# Altium footprint library ZZQ_PCBLib.PcbLib: 84 footprints (part 3 of 6)
Each footprint in its own frame and in the unit in brackets; x right, y up, seen from the top. Pads: shape width x height; smd on the part's side, far side on the other; paste and mask are expansions set on the pad; w line width, h text height; cw(c..) or ccw(c..) is an arc to the next point about the centre after c.
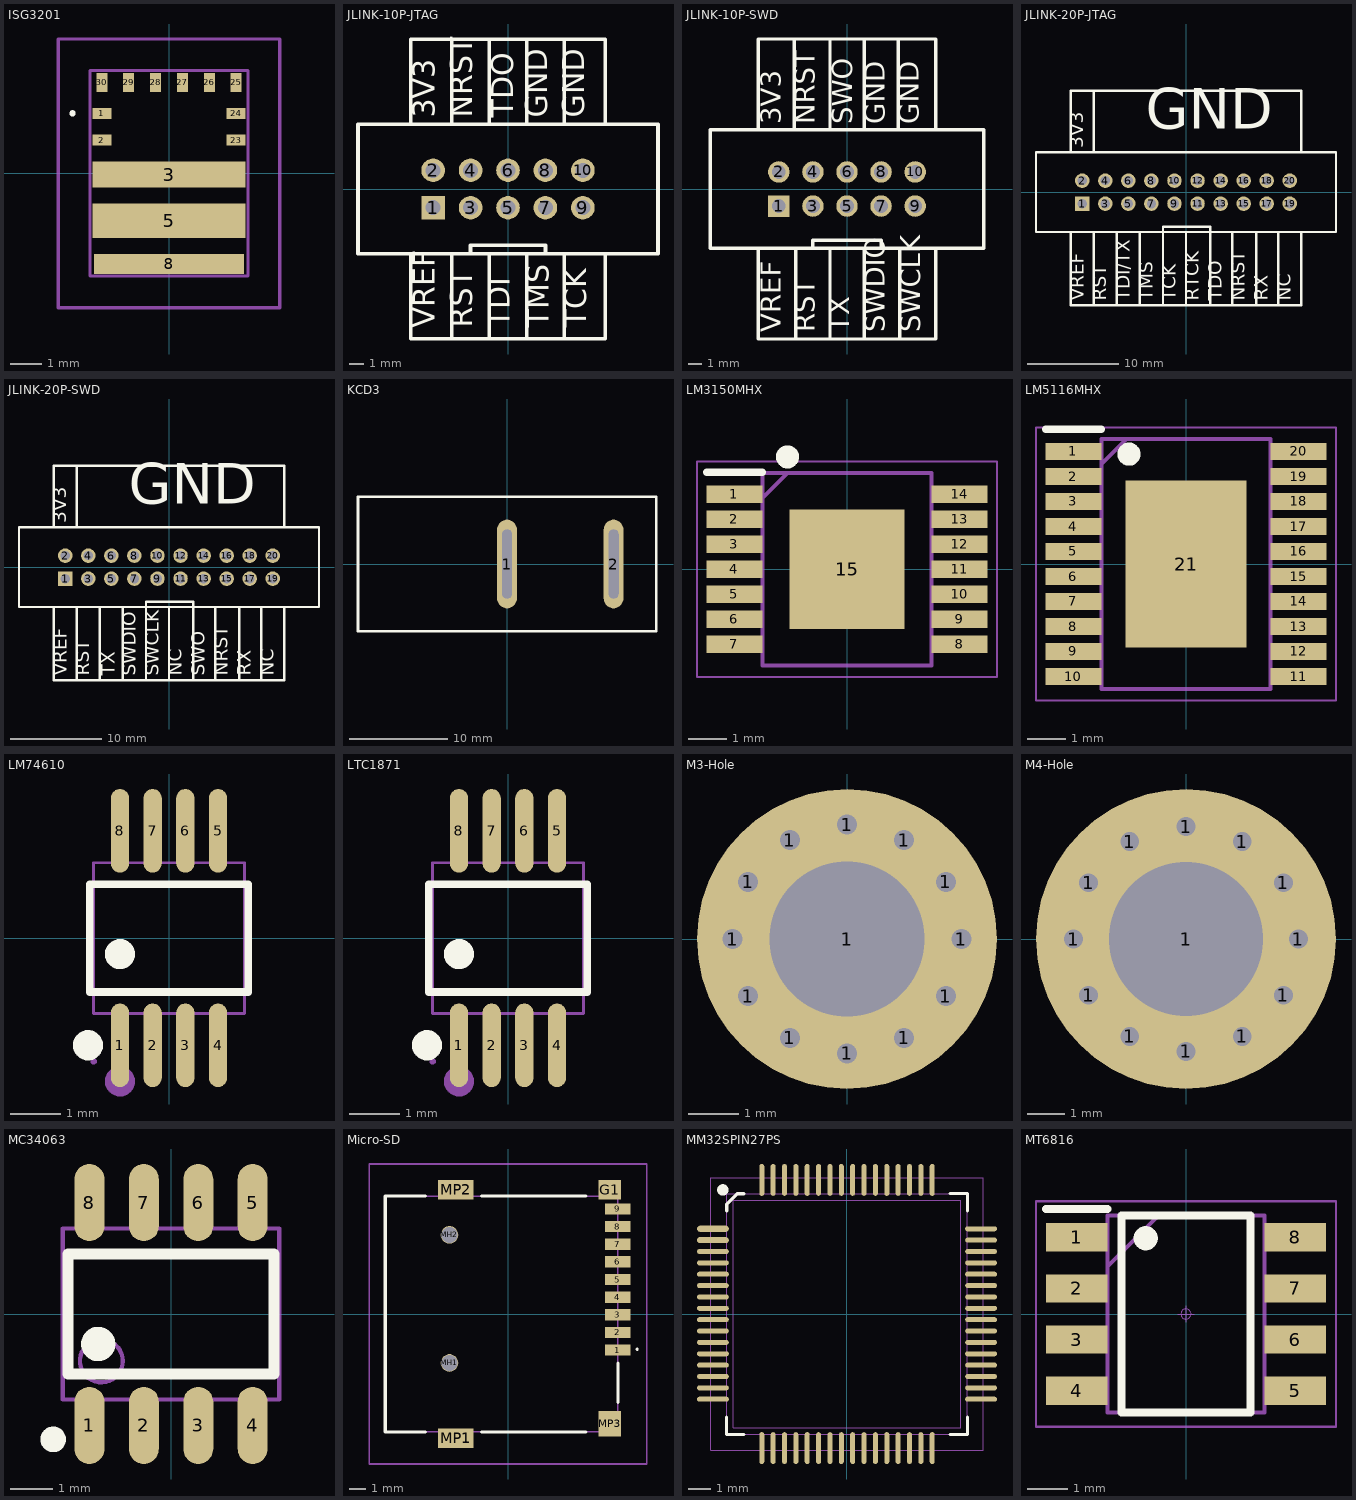
[diagram p2: the footprints below, top view; thin cyan lines are the x and y axes]

## ISG3201 [mm]
pads (13):
  rect 0.6x0.35 smd: 1(-2.125,1.9) 2(-2.125,1.05) 23(2.125,1.05) 24(2.125,1.9)
  rect 4.85x0.825 smd: 3(0,-0.037)
  rect 4.85x1.1 smd: 5(0,-1.5)
  rect 4.75x0.625 smd: 8(0,-2.862)
  rect 0.35x0.6 smd: 25(2.125,2.875) 26(1.275,2.875) 27(0.425,2.875) 28(-0.425,2.875) 29(-1.275,2.875) 30(-2.125,2.875)
Top Overlay:
  lines w0.1: -3.1,1.9 ccw(c-3.05,1.9) -3,1.9 ccw(c-3.05,1.9) -3.1,1.9
Mechanical 15:
  lines w0.1: -2.5,-3.25 -2.5,3.25 2.5,3.25 2.5,-3.25 -2.5,-3.25
Mechanical 20:
  lines w0.1: -3.5,-4.25 -3.5,4.25 3.5,4.25 3.5,-4.25 -3.5,-4.25
3D body "ISG3201.stp": height 1.32, standoff 0, extent -2.5,-3.25 2.5,3.25

## JLINK-10P-JTAG [mm]
pads (10):
  rect 1.6x1.6 hole 1.02: 1(-5.08,-1.27)
  round 1.6 hole 1.02: 2(-5.08,1.27) 3(-2.54,-1.27) 4(-2.54,1.27) 5(0,-1.27) 6(0,1.27) 7(2.54,-1.27) 8(2.54,1.27) 9(5.08,-1.27) 10(5.08,1.27)
Top Overlay:
  lines w0.254: -6.604,-4.445 -6.604,-10.16 6.604,-10.16 6.604,-4.445 ; -6.604,4.445 -6.604,10.16 6.604,10.16 6.604,4.445 ; -3.81,-10.16 -3.81,-4.445 ; -3.81,4.445 -3.81,10.16 ; -2.54,-4.4 -2.54,-3.81 2.54,-3.81 2.54,-4.4 ; -1.27,-10.16 -1.27,-4.445 ; -1.27,4.445 -1.27,10.16 ; 1.27,-10.16 1.27,-4.445 ; 1.27,4.445 1.27,10.16 ; 3.81,-10.16 3.81,-4.445 ; 3.81,4.445 3.81,10.16 ; -10.175,-4.4 10.175,-4.4 10.175,4.4 -10.175,4.4 -10.175,-4.4
  text "VREF" at -4.445,-9.398 h2.54
  text "RST" at -1.924,-9.398 h2.54
  text "TDI" at 0.635,-9.398 h2.54
  text "TMS" at 3.283,-9.398 h2.54
  text "TCK" at 5.826,-9.398 h2.54
  text "GND" at 5.696,4.826 h2.54
  text "GND" at 3.156,4.826 h2.54
  text "TDO" at 0.87,4.826 h2.54
  text "NRST" at -1.924,4.826 h2.54
  text "3V3" at -4.464,4.826 h2.54
3D body "IDC2.54-10P.STEP": height 2.54, standoff -9.63, extent -10.16,-4.35 10.16,4.5

## JLINK-10P-SWD [mm]
pads (10):
  rect 1.6x1.6 hole 1.02: 1(-5.08,-1.27)
  round 1.6 hole 1.02: 2(-5.08,1.27) 3(-2.54,-1.27) 4(-2.54,1.27) 5(0,-1.27) 6(0,1.27) 7(2.54,-1.27) 8(2.54,1.27) 9(5.08,-1.27) 10(5.08,1.27)
Top Overlay:
  lines w0.254: -6.604,-4.445 -6.604,-11.176 6.604,-11.176 6.604,-4.445 ; -6.604,4.445 -6.604,11.176 6.604,11.176 6.604,4.445 ; -3.937,4.445 -3.937,11.176 ; -3.81,-11.176 -3.81,-4.445 ; -2.54,-4.4 -2.54,-3.81 2.54,-3.81 2.54,-4.4 ; -1.27,-11.176 -1.27,-4.445 ; -1.27,4.445 -1.27,11.176 ; 1.27,-11.176 1.27,-4.445 ; 1.27,4.445 1.27,11.176 ; 3.81,4.445 3.81,11.176 ; 3.937,-11.176 3.937,-4.445 ; -10.175,-4.4 10.175,-4.4 10.175,4.4 -10.175,4.4 -10.175,-4.4
  text "VREF" at -4.445,-10.668 h2.54
  text "RST" at -1.924,-10.668 h2.54
  text "TX" at 0.635,-10.668 h2.54
  text "SWDIO" at 3.283,-10.668 h2.54
  text "SWCLK" at 5.95,-10.668 h2.54
  text "GND" at 5.823,4.826 h2.54
  text "GND" at 3.283,4.826 h2.54
  text "SWO" at 0.87,4.826 h2.54
  text "NRST" at -1.924,4.826 h2.54
  text "3V3" at -4.464,4.826 h2.54
3D body "IDC2.54-10P.STEP": height 2.54, standoff -9.63, extent -10.16,-4.35 10.16,4.5

## JLINK-20P-JTAG [mm]
pads (20):
  rect 1.6x1.6 hole 1.02: 1(-11.43,-1.27)
  round 1.6 hole 1.02: 2(-11.43,1.27) 3(-8.89,-1.27) 4(-8.89,1.27) 5(-6.35,-1.27) 6(-6.35,1.27) 7(-3.81,-1.27) 8(-3.81,1.27) 9(-1.27,-1.27) 10(-1.27,1.27) 11(1.27,-1.27) 12(1.27,1.27) 13(3.81,-1.27) 14(3.81,1.27) 15(6.35,-1.27) 16(6.35,1.27) 17(8.89,-1.27) 18(8.89,1.27) 19(11.43,-1.27) 20(11.43,1.27)
Top Overlay:
  lines w0.254: -12.7,-4.445 -12.7,-12.446 12.7,-12.446 12.7,-4.445 ; -12.7,4.445 -12.7,11.176 12.7,11.176 12.7,4.445 ; -10.16,-12.446 -10.16,-4.445 ; -10.16,4.445 -10.16,11.176 ; -7.62,-12.319 -7.62,-4.445 ; -5.08,-12.319 -5.08,-4.445 ; -2.54,-12.446 -2.54,-4.445 ; -2.54,-4.4 -2.54,-3.81 2.667,-3.81 2.667,-4.445 2.667,-12.446 ; 0,-12.446 0,-4.445 ; 5.08,-12.446 5.08,-4.445 ; 7.747,-12.446 7.747,-4.445 ; 10.16,-12.446 10.16,-4.445 ; -16.525,-4.4 16.525,-4.4 16.525,4.4 -16.525,4.4 -16.525,-4.4
  text "GND" at -4.445,5.517 h7.62
  text "3V3" at -10.814,4.826 h2.54
  text "VREF" at -10.795,-11.938 h2.54
  text "RST" at -8.274,-11.938 h2.54
  text "TDI/TX" at -5.689,-11.938 h2.54
  text "TMS" at -3.194,-11.938 h2.54
  text "TCK" at -0.651,-11.938 h2.54
  text "RTCK" at 1.889,-11.938 h2.54
  text "TDO" at 4.426,-11.938 h2.54
  text "NRST" at 6.966,-11.938 h2.54
  text "RX" at 9.525,-11.938 h2.54
  text "NC" at 12.049,-11.938 h2.54
3D body "IDC2.54-20P.STEP": height 9.17, standoff -3, extent -16.51,-4.35 16.51,4.5

## JLINK-20P-SWD [mm]
pads (20):
  rect 1.6x1.6 hole 1.02: 1(-11.43,-1.27)
  round 1.6 hole 1.02: 2(-11.43,1.27) 3(-8.89,-1.27) 4(-8.89,1.27) 5(-6.35,-1.27) 6(-6.35,1.27) 7(-3.81,-1.27) 8(-3.81,1.27) 9(-1.27,-1.27) 10(-1.27,1.27) 11(1.27,-1.27) 12(1.27,1.27) 13(3.81,-1.27) 14(3.81,1.27) 15(6.35,-1.27) 16(6.35,1.27) 17(8.89,-1.27) 18(8.89,1.27) 19(11.43,-1.27) 20(11.43,1.27)
Top Overlay:
  lines w0.254: -12.7,-4.445 -12.7,-12.446 12.7,-12.446 12.7,-4.445 ; -12.7,4.445 -12.7,11.176 12.7,11.176 12.7,4.445 ; -10.16,-12.446 -10.16,-4.445 ; -10.16,4.445 -10.16,11.176 ; -7.62,-12.319 -7.62,-4.445 ; -5.08,-12.319 -5.08,-4.445 ; -2.54,-12.446 -2.54,-4.445 ; -2.54,-4.4 -2.54,-3.81 2.667,-3.81 2.667,-4.445 2.667,-12.446 ; 0,-12.446 0,-4.445 ; 5.08,-12.446 5.08,-4.445 ; 7.747,-12.446 7.747,-4.445 ; 10.16,-12.446 10.16,-4.445 ; -16.525,-4.4 -16.525,4.4 16.525,4.4 16.525,-4.4 -16.525,-4.4
  text "NC" at 12.049,-11.938 h2.54
  text "RX" at 9.525,-11.938 h2.54
  text "NRST" at 6.966,-11.938 h2.54
  text "SWO" at 4.426,-11.938 h2.54
  text "NC" at 1.889,-11.938 h2.54
  text "SWCLK" at -0.654,-11.938 h2.54
  text "SWDIO" at -3.194,-11.938 h2.54
  text "TX" at -5.461,-11.938 h2.54
  text "RST" at -8.274,-11.938 h2.54
  text "VREF" at -10.795,-11.938 h2.54
  text "3V3" at -10.814,4.826 h2.54
  text "GND" at -4.445,5.517 h7.62
3D body "IDC2.54-20P.STEP": height 9.17, standoff -3, extent -16.51,-4.35 16.51,4.5

## KCD3 [mm]
pads (2):
  oval 2x9 hole 1 slot 7 at 90 deg: 1(0,0) 2(10.8,0)
Top Overlay:
  lines w0.254: -15.1,-6.8 -15.1,6.8 15.1,6.8 15.1,-6.8 -15.1,-6.8
3D body "KCD3 - BG.STEP": height 29.48, standoff -8.5, extent -16.244,-6.75 16.256,6.75

## LM3150MHX [mm]
pads (15):
  rect 1.45x0.45 smd: 1(-2.925,1.95) 2(-2.925,1.3) 3(-2.925,0.65) 4(-2.925,0) 5(-2.925,-0.65) 6(-2.925,-1.3) 7(-2.925,-1.95) 8(2.925,-1.95) 9(2.925,-1.3) 10(2.925,-0.65) 11(2.925,0) 12(2.925,0.65) 13(2.925,1.3) 14(2.925,1.95)
  rect 3x3.1 smd: 15(0,0)
Top Overlay:
  lines w0.2: -3.65,2.525 -2.2,2.525
  lines w0.3: -1.404,2.965 ccw(c-1.547,2.921) -1.397,2.921
Mechanical 13:
  lines w0.1: -2.2,1.85 -1.55,2.5 ; -2.2,-2.5 2.2,-2.5 2.2,2.5 -2.2,2.5 -2.2,-2.5
Mechanical 15:
  lines w0.05: -3.9,-2.8 3.9,-2.8 3.9,2.8 -3.9,2.8 -3.9,-2.8
3D body "LM3150MHX_NOPB.stp": height 1, standoff 0, extent -3.21,-2.5 3.21,2.5

## LM5116MHX [mm]
pads (21):
  rect 1.45x0.45 smd: 1(-2.925,2.925) 2(-2.925,2.275) 3(-2.925,1.625) 4(-2.925,0.975) 5(-2.925,0.325) 6(-2.925,-0.325) 7(-2.925,-0.975) 8(-2.925,-1.625) 9(-2.925,-2.275) 10(-2.925,-2.925) 11(2.925,-2.925) 12(2.925,-2.275) 13(2.925,-1.625) 14(2.925,-0.975) 15(2.925,-0.325) 16(2.925,0.325) 17(2.925,0.975) 18(2.925,1.625) 19(2.925,2.275) 20(2.925,2.925)
  rect 3.15x4.35 smd: 21(0,0)
Top Overlay:
  circle w0.3: c-1.483,2.856 r0.15
  lines w0.2: -3.65,3.5 -2.2,3.5
Mechanical 13:
  lines w0.1: -2.2,2.6 -1.55,3.25 ; -2.2,-3.25 2.2,-3.25 2.2,3.25 -2.2,3.25 -2.2,-3.25
Mechanical 15:
  lines w0.05: -3.9,-3.55 3.9,-3.55 3.9,3.55 -3.9,3.55 -3.9,-3.55
3D body "LM5116MHX_NOPB.stp": height 1.1, standoff 0, extent -3.2,-3.25 3.2,3.25

## LM74610 [mm]
pads (8):
  oval 0.364x1.662 smd paste+0 mask+0.051: 1(-0.975,-2.131) 2(-0.325,-2.131) 3(0.325,-2.131) 4(0.975,-2.131) 5(0.975,2.131) 6(0.325,2.131) 7(-0.325,2.131) 8(-0.975,2.131)
Top Overlay:
  circle w0.3: c-1.609,-2.131 r0.15
  circle w0.3: c-0.975,-0.319 r0.15
  lines w0.152: -1.576,-1.071 1.576,-1.071 1.576,1.071 -1.576,1.071 -1.576,-1.071
Mechanical 6:
  circle w0.3: c-0.975,-2.85 r0.15
Mechanical 15:
  region: 0.817,1.91 0.817,1.49 1.133,1.49 1.133,1.91
  region: 0.817,2.45 0.817,1.9 1.133,1.9 1.133,2.45
  region: 0.167,1.91 0.167,1.49 0.482,1.49 0.482,1.91
  region: 0.167,2.45 0.167,1.9 0.482,1.9 0.482,2.45
  region: -0.482,1.91 -0.482,1.49 -0.167,1.49 -0.167,1.91
  region: -0.482,2.45 -0.482,1.9 -0.167,1.9 -0.167,2.45
  region: -1.133,1.91 -1.133,1.49 -0.817,1.49 -0.817,1.91
  region: -1.133,2.45 -1.133,1.9 -0.817,1.9 -0.817,2.45
  region: 0.817,-1.91 0.817,-1.49 1.133,-1.49 1.133,-1.91
  region: 0.817,-2.45 0.817,-1.9 1.133,-1.9 1.133,-2.45
  region: 0.167,-1.91 0.167,-1.49 0.482,-1.49 0.482,-1.91
  region: 0.167,-2.45 0.167,-1.9 0.482,-1.9 0.482,-2.45
  region: -0.482,-1.91 -0.482,-1.49 -0.167,-1.49 -0.167,-1.91
  region: -0.482,-2.45 -0.482,-1.9 -0.167,-1.9 -0.167,-2.45
  region: -1.133,-1.91 -1.133,-1.49 -0.817,-1.49 -0.817,-1.91
  region: -1.133,-2.45 -1.133,-1.9 -0.817,-1.9 -0.817,-2.45
  region: -1.44,-2.45 -1.44,-2.425 -1.475,-2.39 -1.525,-2.39 -1.56,-2.425 -1.56,-2.45 -1.56,-2.475 -1.525,-2.51 -1.475,-2.51 -1.44,-2.475
  lines w0.051: -1.5,-1.5 1.5,-1.5 1.5,1.5 -1.5,1.5 -1.5,-1.5

## LTC1871 [mm]
pads (8):
  oval 0.364x1.662 smd paste+0 mask+0.051: 1(-0.975,-2.131) 2(-0.325,-2.131) 3(0.325,-2.131) 4(0.975,-2.131) 5(0.975,2.131) 6(0.325,2.131) 7(-0.325,2.131) 8(-0.975,2.131)
Top Overlay:
  circle w0.3: c-0.975,-0.319 r0.15
  circle w0.3: c-1.609,-2.131 r0.15
  lines w0.152: -1.576,-1.071 -1.576,1.071 1.576,1.071 1.576,-1.071 -1.576,-1.071
Mechanical 6:
  circle w0.3: c-0.975,-2.85 r0.15
Mechanical 15:
  region: -1.44,-2.45 -1.44,-2.425 -1.475,-2.39 -1.525,-2.39 -1.56,-2.425 -1.56,-2.45 -1.56,-2.475 -1.525,-2.51 -1.475,-2.51 -1.44,-2.475
  region: -1.133,-2.45 -1.133,-1.9 -0.817,-1.9 -0.817,-2.45
  region: -1.133,-1.91 -1.133,-1.49 -0.817,-1.49 -0.817,-1.91
  region: -0.482,-2.45 -0.482,-1.9 -0.167,-1.9 -0.167,-2.45
  region: -0.482,-1.91 -0.482,-1.49 -0.167,-1.49 -0.167,-1.91
  region: 0.167,-2.45 0.167,-1.9 0.482,-1.9 0.482,-2.45
  region: 0.167,-1.91 0.167,-1.49 0.482,-1.49 0.482,-1.91
  region: 0.817,-2.45 0.817,-1.9 1.133,-1.9 1.133,-2.45
  region: 0.817,-1.91 0.817,-1.49 1.133,-1.49 1.133,-1.91
  region: -1.133,2.45 -1.133,1.9 -0.817,1.9 -0.817,2.45
  region: -1.133,1.91 -1.133,1.49 -0.817,1.49 -0.817,1.91
  region: -0.482,2.45 -0.482,1.9 -0.167,1.9 -0.167,2.45
  region: -0.482,1.91 -0.482,1.49 -0.167,1.49 -0.167,1.91
  region: 0.167,2.45 0.167,1.9 0.482,1.9 0.482,2.45
  region: 0.167,1.91 0.167,1.49 0.482,1.49 0.482,1.91
  region: 0.817,2.45 0.817,1.9 1.133,1.9 1.133,2.45
  region: 0.817,1.91 0.817,1.49 1.133,1.49 1.133,1.91
  lines w0.051: -1.5,-1.5 -1.5,1.5 1.5,1.5 1.5,-1.5 -1.5,-1.5

## M3-Hole [mm]
pads (13):
  round 0.5 hole 0.4: 1(-2.286,0) 1(-1.98,-1.143) 1(-1.98,1.143) 1(-1.143,-1.98) 1(-1.143,1.98) 1(0,-2.286) 1(0,2.286) 1(1.143,-1.98) 1(1.143,1.98) 1(1.98,-1.143) 1(1.98,1.143) 1(2.286,0)
  round 6 hole 3.1: 1(0,0)

## M4-Hole [mm]
pads (13):
  round 0.7 hole 0.5: 1(-3,0) 1(-2.598,-1.5) 1(-2.598,1.5) 1(-1.5,-2.598) 1(-1.5,2.598) 1(0,-3) 1(0,3) 1(1.5,-2.598) 1(1.5,2.598) 1(2.598,-1.5) 1(2.598,1.5) 1(3,0)
  round 8 hole 4.1: 1(0,0)

## MC34063 [mm]
pads (8):
  oval 0.7x1.8 smd: 1(-1.905,-2.6) 2(-0.635,-2.6) 3(0.635,-2.6) 4(1.905,-2.6) 5(1.905,2.6) 6(0.635,2.6) 7(-0.635,2.6) 8(-1.905,2.6)
Top Overlay:
  circle w0.4: c-1.7,-0.7 r0.2
  circle w0.3: c-2.75,-2.925 r0.15
  lines w0.254: -2.4,-1.4 -2.4,1.4 2.4,1.4 2.4,-1.4 -2.4,-1.4
Mechanical 13:
  circle w0.1: c-1.625,-1.095 r0.5
  lines w0.1: -2.525,-1.995 -2.525,1.995 2.525,1.995 2.525,-1.995 -2.525,-1.995
3D body "User Library-SOIC-8-150.STEP": height 1.75, standoff 0, extent -2.5,-3.1 2.5,3.1

## Micro-SD [mm]
pads (15):
  rect 1.6x0.7 smd: 1(6.85,-2.25) 2(6.85,-1.15) 3(6.85,-0.05) 4(6.85,1.05) 5(6.85,2.15) 6(6.85,3.25) 7(6.85,4.35) 8(6.85,5.45) 9(6.85,6.55)
  rect 1.4x1.2 smd: G1(6.35,7.75)
  round 1.1 hole 1 unplated: MH1(-3.65,-3.05) MH2(-3.65,4.93)
  rect 2.2x1.2 smd: MP1(-3.25,-7.75) MP2(-3.25,7.75)
  rect 1.4x1.6 smd: MP3(6.35,-6.85)
Top Overlay:
  lines w0.1: 8,-2.2 ccw(c8.05,-2.2) 8.1,-2.2 ccw(c8.05,-2.2) 8,-2.2
  lines w0.2: -5.15,-7.35 -7.65,-7.35 -7.65,7.35 -5.15,7.35 ; -1.65,-7.35 4.85,-7.35 ; -1.65,7.35 4.85,7.35 ; 6.85,-5.5 6.85,-3.05
Mechanical 13:
  lines w0.1: -7.65,-7.35 6.85,-7.35 6.85,7.35 -7.65,7.35 -7.65,-7.35
Mechanical 15:
  lines w0.1: -8.65,-9.35 8.65,-9.35 8.65,9.35 -8.65,9.35 -8.65,-9.35
3D body "TFP09-2-12B.stp": height 1.85, standoff -0.6, extent -7.769,-7.984 7.434,8.116

## MM32SPIN27PS [mm]
pads (64):
  rrect100% 1.4x0.27 smd: 1(-5.9,3.75) 2(-5.9,3.25)
  rrect100% 1.4x0.22 smd: 3(-5.9,2.75) 4(-5.9,2.25) 5(-5.9,1.75) 6(-5.9,1.25) 7(-5.9,0.75) 8(-5.9,0.25) 9(-5.9,-0.25) 10(-5.9,-0.75) 11(-5.9,-1.25) 12(-5.9,-1.75) 13(-5.9,-2.25) 14(-5.9,-2.75) 15(-5.9,-3.25) 16(-5.9,-3.75) 33(5.9,-3.75) 34(5.9,-3.25) 35(5.9,-2.75) 36(5.9,-2.25) 37(5.9,-1.75) 38(5.9,-1.25) 39(5.9,-0.75) 40(5.9,-0.25) 41(5.9,0.25) 42(5.9,0.75) 43(5.9,1.25) 44(5.9,1.75) 45(5.9,2.25) 46(5.9,2.75) 47(5.9,3.25) 48(5.9,3.75)
  rrect100% 0.22x1.4 smd: 17(-3.75,-5.9) 18(-3.25,-5.9) 19(-2.75,-5.9) 20(-2.25,-5.9) 21(-1.75,-5.9) 22(-1.25,-5.9) 23(-0.75,-5.9) 24(-0.25,-5.9) 25(0.25,-5.9) 26(0.75,-5.9) 27(1.25,-5.9) 28(1.75,-5.9) 29(2.25,-5.9) 30(2.75,-5.9) 31(3.25,-5.9) 32(3.75,-5.9) 49(3.75,5.9) 50(3.25,5.9) 51(2.75,5.9) 52(2.25,5.9) 53(1.75,5.9) 54(1.25,5.9) 55(0.75,5.9) 56(0.25,5.9) 57(-0.25,5.9) 58(-0.75,5.9) 59(-1.25,5.9) 60(-1.75,5.9) 61(-2.25,5.9) 62(-2.75,5.9) 63(-3.25,5.9) 64(-3.75,5.9)
Top Overlay:
  circle w0.25: c-5.461,5.461 r0.125
  lines w0.15: -5.3,-4.538 -5.3,-5.3 -4.538,-5.3 ; -5.3,4.826 -4.826,5.3 ; 4.538,-5.3 5.3,-5.3 5.3,-4.538 ; 4.538,5.3 5.3,5.3 5.3,4.538
  lines w0.153: -5.3,4.538 -5.3,4.826 ; -4.826,5.3 -4.538,5.3
Mechanical 15:
  lines w0.05: -6,-6 6,-6 6,6 -6,6 -6,-6 ; -5.3,-5.3 5.3,-5.3 5.3,5.3 -5.3,5.3 -5.3,-5.3 ; -5,-5 5,-5 5,5 -5,5 -5,-5

## MT6816 [mm]
pads (8):
  rect 1.525x0.7 smd: 1(-2.712,1.905) 2(-2.712,0.635) 3(-2.712,-0.635) 4(-2.712,-1.905) 5(2.712,-1.905) 6(2.712,-0.635) 7(2.712,0.635) 8(2.712,1.905)
Top Overlay:
  circle w0.3: c-1.001,1.882 r0.15
  lines w0.2: -3.475,2.605 -1.95,2.605 ; -1.6,-2.45 1.6,-2.45 1.6,2.45 -1.6,2.45 -1.6,-2.45
Mechanical 13:
  lines w0.1: -1.95,1.18 -0.68,2.45 ; -1.95,-2.45 1.95,-2.45 1.95,2.45 -1.95,2.45 -1.95,-2.45
Mechanical 15:
  circle w0.025: c0,0 r0.127
  lines w0.025: -0.2,0 0.2,0 ; 0,-0.2 0,0.2
  lines w0.05: -3.725,-2.8 3.725,-2.8 3.725,2.8 -3.725,2.8 -3.725,-2.8
3D body "mt6816.stp": height 1.75, standoff 0, extent -3,-2.45 3,2.45